# Altium footprint library 2016AbbasBasereh9365731239.PcbLib: 204 footprints (part 5 of 13)
Each footprint in its own frame and in the unit in brackets; x right, y up, seen from the top. Pads: shape width x height; smd on the part's side, far side on the other; paste and mask are expansions set on the pad; w line width, h text height; cw(c..) or ccw(c..) is an arc to the next point about the centre after c.
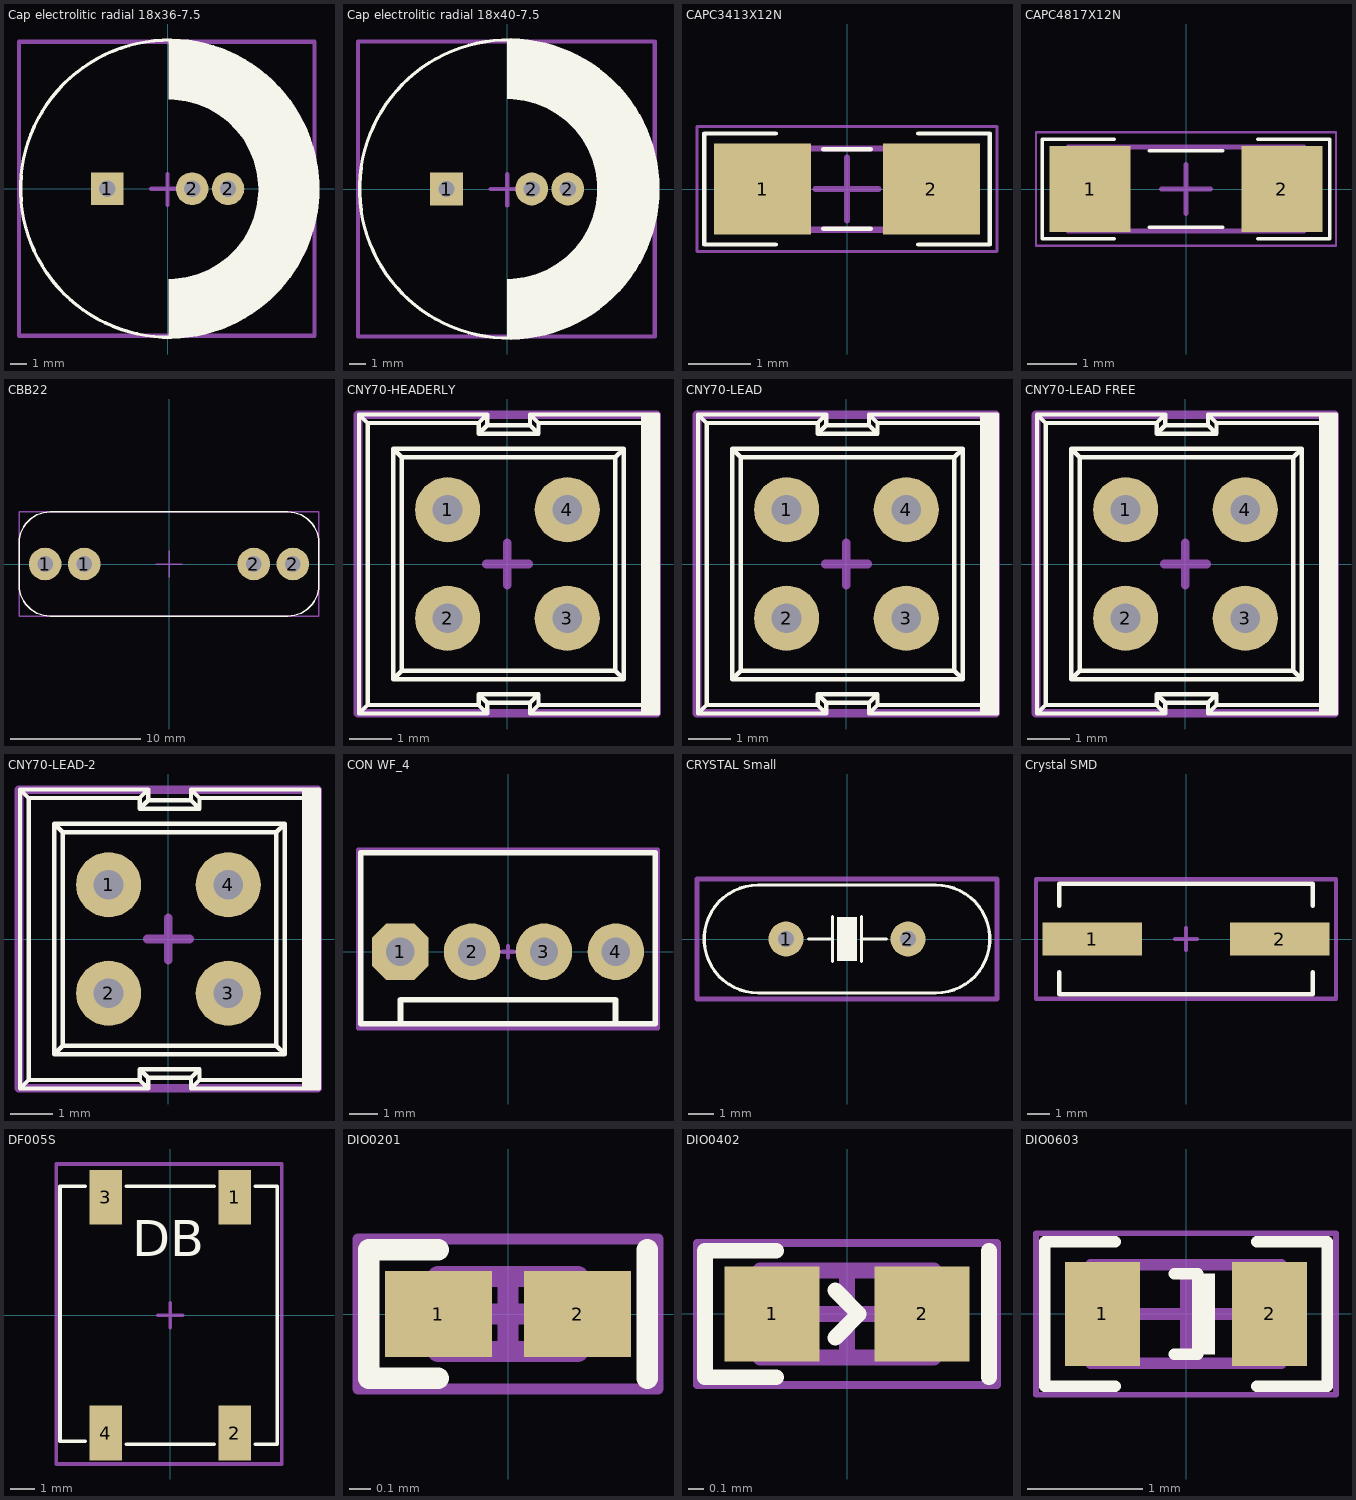
[diagram p4: the footprints below, top view; thin cyan lines are the x and y axes]

## Cap electrolitic radial 18x36-7.5 [mm] "Cap electrolitic radial 18x36-7.5-Design:Abbas Basereh"
height 36
pads (3):
  rect 2x2 hole 1: 1(-3.7,0)
  round 2 hole 1: 2(1.5,0) 2(3.7,0)
Top Overlay:
  circle w0.2: c0.096,0 r9.1
  region: 0.074,9.065 0.17,9.065 0.617,9.065 1.506,8.977 2.383,8.803 3.239,8.543 4.065,8.201 4.854,7.78 5.597,7.283 6.288,6.716 6.92,6.083 7.488,5.392 7.984,4.649 8.406,3.86 8.748,3.034 9.008,2.179 9.182,1.302 9.27,0.412 9.27,-0.035 9.27,-0.482 9.182,-1.372 9.008,-2.249 8.748,-3.105 8.406,-3.931 7.984,-4.719 7.488,-5.463 6.92,-6.154 6.288,-6.786 5.597,-7.353 4.854,-7.85 4.065,-8.271 3.239,-8.614 2.383,-8.873 1.506,-9.047 0.617,-9.135 0.17,-9.135 0.074,-9.135 0.074,-5.535 0.433,-5.523 1.147,-5.429 1.842,-5.243 2.506,-4.968 3.129,-4.608 3.7,-4.17 4.209,-3.662 4.647,-3.091 5.006,-2.468 5.282,-1.803 5.468,-1.108 5.562,-0.395 5.574,-0.035 5.562,0.325 5.468,1.038 5.282,1.733 5.006,2.397 4.647,3.021 4.209,3.591 3.7,4.1 3.129,4.538 2.506,4.898 1.842,5.173 1.147,5.359 0.433,5.453 0.074,5.465
Mechanical 15:
  lines w0.254: -1,0 1,0 ; 0,-1 0,0.9 ; -9.1,-9 -9.1,9 9,9 9,-9 -9.1,-9
3D body "User Library-Cap-EL(18x36-7_5)T.STEP": height 37, standoff -3, extent -9,-9 9.002,9

## Cap electrolitic radial 18x40-7.5 [mm] "Cap electrolitic radial 18x40-7.5-Design:Abbas Basereh"
height 40
pads (3):
  rect 2x2 hole 1: 1(-3.7,0)
  round 2 hole 1: 2(1.5,0) 2(3.7,0)
Top Overlay:
  circle w0.2: c0.096,0 r9.1
  region: 0.004,9.1 0.1,9.1 0.547,9.1 1.437,9.012 2.314,8.838 3.169,8.578 3.995,8.236 4.784,7.815 5.527,7.318 6.219,6.751 6.851,6.119 7.418,5.427 7.915,4.684 8.336,3.895 8.678,3.069 8.938,2.214 9.112,1.337 9.2,0.447 9.2,0 9.2,-0.447 9.112,-1.337 8.938,-2.214 8.678,-3.069 8.336,-3.895 7.915,-4.684 7.418,-5.427 6.851,-6.119 6.219,-6.751 5.527,-7.318 4.784,-7.815 3.995,-8.236 3.169,-8.578 2.314,-8.838 1.437,-9.012 0.547,-9.1 0.1,-9.1 0.004,-9.1 0.004,-5.5 0.364,-5.488 1.077,-5.394 1.772,-5.208 2.437,-4.933 3.06,-4.573 3.63,-4.135 4.139,-3.626 4.577,-3.056 4.937,-2.433 5.212,-1.768 5.398,-1.073 5.492,-0.36 5.504,0 5.492,0.36 5.398,1.073 5.212,1.768 4.937,2.433 4.577,3.056 4.139,3.626 3.63,4.135 3.06,4.573 2.437,4.933 1.772,5.208 1.077,5.394 0.364,5.488 0.004,5.5
Mechanical 15:
  lines w0.254: -1,0 1,0 ; 0,-1 0,0.9 ; -9.1,-9 -9.1,9 9,9 9,-9 -9.1,-9
3D body "User Library-Cap-EL(18x40-7_5)T.STEP": height 41, standoff -3, extent -9,-8.999 9.002,9

## CAPC3413X12N [mm] "Chip Capacitor, 2-Leads, Body 3/40x1/30mm, IPC Medium Density-Design:Abbas Basereh"
height 1.2
pads (2):
  rect 1.55x1.45 smd: 1(-1.35,0) 2(1.35,0)
Top Overlay:
  lines w0.07: -1.143,-0.889 -2.286,-0.889 -2.286,0.889 -1.143,0.889 ; -0.381,-0.635 0.381,-0.635 ; -0.381,0.635 0.381,0.635 ; 1.143,-0.889 2.286,-0.889 2.286,0.889 1.143,0.889
Mechanical 13:
  lines w0.1: -1.7,-0.65 1.7,-0.65 1.7,0.65 -1.7,0.65 -1.7,-0.65
Mechanical 15:
  lines w0.05: -2.4,-1 2.4,-1 2.4,1 -2.4,1 -2.4,-1
  lines w0.1: -0.5,0 0.5,0 ; 0,-0.5 0,0.5
3D body "SW3dPS-0805 SMD Capacitor.STEP": height 0.78, standoff 0, extent -1,-0.625 1,0.625

## CAPC4817X12N [mm] "Chip Capacitor, 2-Leads, Body 4/80x1/70mm, IPC Medium Density-Design:Abbas Basereh"
height 1.2
pads (2):
  rect 1.65x1.75 smd: 1(-1.95,0) 2(1.95,0)
Top Overlay:
  lines w0.07: -1.46,-1.016 -2.921,-1.016 -2.921,1.016 -1.46,1.016 ; -0.75,-0.775 0.75,-0.775 ; -0.75,0.775 0.75,0.775 ; 1.46,-1.016 2.921,-1.016 2.921,1.016 1.46,1.016
Mechanical 13:
  lines w0.1: -2.4,-0.85 -2.4,0.85 2.4,0.85 2.4,-0.85 -2.4,-0.85
Mechanical 15:
  lines w0.05: -3.05,-1.15 -3.05,1.15 3.05,1.15 3.05,-1.15 -3.05,-1.15
  lines w0.1: -0.5,0 0.5,0 ; 0,-0.5 0,0.5
3D body "SW3dPS-1206 SMD Capacitor.STEP": height 1, standoff 0, extent -1.6,-0.8 1.6,0.8

## CBB22 [mm] "W23_0_H14_5_T8_0_P19"
height 13
pads (4):
  round 2.5 hole 1.2: 1(-9.5,0) 1(-6.5,0) 2(6.5,0) 2(9.5,0)
Top Overlay:
  lines w0.1: -11.5,-1.587 ccw(c-9.087,-1.587) -9.087,-4 9.087,-4 ccw(c9.087,-1.587) 11.5,-1.587 11.5,0 11.5,1.587 ccw(c9.087,1.587) 9.087,4 0,4 -9.087,4 ccw(c-9.087,1.587) -11.5,1.587 -11.5,0 -11.5,-1.587
Mechanical 15:
  lines w0.1: -1,0 1,0 ; 0,-1 0,1 ; -11.5,-4 -11.5,4 11.5,4 11.5,-4 -11.5,-4
3D body "User Library-CBB81_W23_0_H14_5_T8_0_P19_0.STEP": height 19.5, standoff -8, extent -11.499,-4 11.5,4

## CNY70-HEADERLY [mm] "Dimensions (L x W x H in mm): 7 x 7 x 6  • Peak operating distance: < 0.5 mm DESIGNER ABBAS BASEREH"
height 6
pads (4):
  round 1.524 hole 0.7: 1(-1.4,1.27) 2(-1.4,-1.27) 3(1.4,-1.27) 4(1.4,1.27)
Top Overlay:
  rectangle: 3.125,-3.5 3.525,3.5
  lines w0.1: -3.475,-3.5 -3.475,3.5 ; -3.475,-3.5 -3.275,-3.3 ; -3.475,-3.5 -0.475,-3.5 ; -3.475,3.5 -0.475,3.5 ; -3.475,3.5 -3.275,3.3 ; -3.275,-3.3 -3.275,3.3 ; -3.275,-3.3 -0.675,-3.3 ; -3.275,3.3 -0.675,3.3 ; -2.675,-2.7 2.725,-2.7 ; -2.675,-2.7 -2.675,2.7 ; -2.675,-2.7 -2.475,-2.5 ; -2.675,2.7 2.725,2.7 ; -2.675,2.7 -2.475,2.5 ; -2.475,-2.5 2.525,-2.5 ; -2.475,-2.5 -2.475,2.5 ; -2.475,2.5 2.525,2.5 ; -0.675,-3.3 -0.475,-3.5 ; -0.675,-3.3 -0.675,-3.05 ; -0.675,-3.05 -0.475,-3.25 ; -0.675,-3.05 0.725,-3.05 ; -0.675,3.05 -0.475,3.25 ; -0.675,3.05 -0.675,3.3 ; -0.675,3.05 0.725,3.05 ; -0.675,3.3 -0.475,3.5 ; -0.475,-3.5 -0.475,-3.25 ; -0.475,-3.25 0.525,-3.25 ; -0.475,3.25 -0.475,3.5 ; -0.475,3.25 0.525,3.25 ; 0.525,-3.5 0.525,-3.25 ; 0.525,-3.5 0.725,-3.3 ; 0.525,-3.5 3.525,-3.5 ; 0.525,-3.25 0.725,-3.05 ; 0.525,3.25 0.525,3.5 ; 0.525,3.25 0.725,3.05 ; 0.525,3.5 3.525,3.5 ; 0.525,3.5 0.725,3.3 ; 0.725,-3.3 0.725,-3.05 ; 0.725,-3.3 3.325,-3.3 ; 0.725,3.05 0.725,3.3 ; 0.725,3.3 3.325,3.3 ; 2.525,-2.5 2.525,2.5 ; 2.525,-2.5 2.725,-2.7 ; 2.525,2.5 2.725,2.7 ; 2.725,-2.7 2.725,2.7 ; 3.325,-3.3 3.325,3.3 ; 3.325,-3.3 3.525,-3.5 ; 3.325,3.3 3.525,3.5 ; 3.525,-3.5 3.525,3.5
Mechanical 15:
  lines w0.2: -0.5,0 0.5,0 ; 0,-0.5 0,0.5 ; -3.5,-3.5 3.5,-3.5 3.5,3.5 -3.5,3.5 -3.5,-3.5
3D body "User Library-cny70-2.STEP": height 11.5, standoff -2.5, extent -3.55,-3.5 3.45,3.5

## CNY70-LEAD [mm] "Dimensions (L x W x H in mm): 7 x 7 x 6  • Peak operating distance: < 0.5 mm DESIGNER ABBAS BASEREH"
height 6
pads (4):
  round 1.524 hole 0.7: 1(-1.4,1.27) 2(-1.4,-1.27) 3(1.4,-1.27) 4(1.4,1.27)
Top Overlay:
  rectangle: 3.125,-3.5 3.525,3.5
  lines w0.1: -3.475,-3.5 -3.475,3.5 ; -3.475,-3.5 -3.275,-3.3 ; -3.475,-3.5 -0.475,-3.5 ; -3.475,3.5 -0.475,3.5 ; -3.475,3.5 -3.275,3.3 ; -3.275,-3.3 -3.275,3.3 ; -3.275,-3.3 -0.675,-3.3 ; -3.275,3.3 -0.675,3.3 ; -2.675,-2.7 2.725,-2.7 ; -2.675,-2.7 -2.675,2.7 ; -2.675,-2.7 -2.475,-2.5 ; -2.675,2.7 2.725,2.7 ; -2.675,2.7 -2.475,2.5 ; -2.475,-2.5 2.525,-2.5 ; -2.475,-2.5 -2.475,2.5 ; -2.475,2.5 2.525,2.5 ; -0.675,-3.3 -0.475,-3.5 ; -0.675,-3.3 -0.675,-3.05 ; -0.675,-3.05 -0.475,-3.25 ; -0.675,-3.05 0.725,-3.05 ; -0.675,3.05 -0.475,3.25 ; -0.675,3.05 -0.675,3.3 ; -0.675,3.05 0.725,3.05 ; -0.675,3.3 -0.475,3.5 ; -0.475,-3.5 -0.475,-3.25 ; -0.475,-3.25 0.525,-3.25 ; -0.475,3.25 -0.475,3.5 ; -0.475,3.25 0.525,3.25 ; 0.525,-3.5 0.525,-3.25 ; 0.525,-3.5 0.725,-3.3 ; 0.525,-3.5 3.525,-3.5 ; 0.525,-3.25 0.725,-3.05 ; 0.525,3.25 0.525,3.5 ; 0.525,3.25 0.725,3.05 ; 0.525,3.5 3.525,3.5 ; 0.525,3.5 0.725,3.3 ; 0.725,-3.3 0.725,-3.05 ; 0.725,-3.3 3.325,-3.3 ; 0.725,3.05 0.725,3.3 ; 0.725,3.3 3.325,3.3 ; 2.525,-2.5 2.525,2.5 ; 2.525,-2.5 2.725,-2.7 ; 2.525,2.5 2.725,2.7 ; 2.725,-2.7 2.725,2.7 ; 3.325,-3.3 3.325,3.3 ; 3.325,-3.3 3.525,-3.5 ; 3.325,3.3 3.525,3.5 ; 3.525,-3.5 3.525,3.5
Mechanical 15:
  lines w0.2: -0.5,0 0.5,0 ; 0,-0.5 0,0.5 ; -3.5,-3.5 3.5,-3.5 3.5,3.5 -3.5,3.5 -3.5,-3.5
3D body "SW3dPS-cny70-1.STEP": height 6.5, standoff -5.25, extent -3.5,-3.5 3.5,3.5

## CNY70-LEAD FREE [mm] "Dimensions (L x W x H in mm): 7 x 7 x 6  • Peak operating distance: < 0.5 mm DESIGNER ABBAS BASEREH"
height 6
pads (4):
  round 1.524 hole 0.7: 1(-1.4,1.27) 2(-1.4,-1.27) 3(1.4,-1.27) 4(1.4,1.27)
Top Overlay:
  rectangle: 3.125,-3.5 3.525,3.5
  lines w0.1: -3.475,-3.5 -3.475,3.5 ; -3.475,-3.5 -3.275,-3.3 ; -3.475,-3.5 -0.475,-3.5 ; -3.475,3.5 -0.475,3.5 ; -3.475,3.5 -3.275,3.3 ; -3.275,-3.3 -3.275,3.3 ; -3.275,-3.3 -0.675,-3.3 ; -3.275,3.3 -0.675,3.3 ; -2.675,-2.7 2.725,-2.7 ; -2.675,-2.7 -2.675,2.7 ; -2.675,-2.7 -2.475,-2.5 ; -2.675,2.7 2.725,2.7 ; -2.675,2.7 -2.475,2.5 ; -2.475,-2.5 2.525,-2.5 ; -2.475,-2.5 -2.475,2.5 ; -2.475,2.5 2.525,2.5 ; -0.675,-3.3 -0.475,-3.5 ; -0.675,-3.3 -0.675,-3.05 ; -0.675,-3.05 -0.475,-3.25 ; -0.675,-3.05 0.725,-3.05 ; -0.675,3.05 -0.475,3.25 ; -0.675,3.05 -0.675,3.3 ; -0.675,3.05 0.725,3.05 ; -0.675,3.3 -0.475,3.5 ; -0.475,-3.5 -0.475,-3.25 ; -0.475,-3.25 0.525,-3.25 ; -0.475,3.25 -0.475,3.5 ; -0.475,3.25 0.525,3.25 ; 0.525,-3.5 0.525,-3.25 ; 0.525,-3.5 0.725,-3.3 ; 0.525,-3.5 3.525,-3.5 ; 0.525,-3.25 0.725,-3.05 ; 0.525,3.25 0.525,3.5 ; 0.525,3.25 0.725,3.05 ; 0.525,3.5 3.525,3.5 ; 0.525,3.5 0.725,3.3 ; 0.725,-3.3 0.725,-3.05 ; 0.725,-3.3 3.325,-3.3 ; 0.725,3.05 0.725,3.3 ; 0.725,3.3 3.325,3.3 ; 2.525,-2.5 2.525,2.5 ; 2.525,-2.5 2.725,-2.7 ; 2.525,2.5 2.725,2.7 ; 2.725,-2.7 2.725,2.7 ; 3.325,-3.3 3.325,3.3 ; 3.325,-3.3 3.525,-3.5 ; 3.325,3.3 3.525,3.5 ; 3.525,-3.5 3.525,3.5
Mechanical 15:
  lines w0.2: -0.5,0 0.5,0 ; 0,-0.5 0,0.5 ; -3.5,-3.5 3.5,-3.5 3.5,3.5 -3.5,3.5 -3.5,-3.5
3D body "CNY70.STEP": height 6.01, standoff 0.01, extent -3.475,-3.5 3.525,3.5

## CNY70-LEAD-2 [mm] "Dimensions (L x W x H in mm): 7 x 7 x 6  • Peak operating distance: < 0.5 mm DESIGNER ABBAS BASEREH"
height 6
pads (4):
  round 1.524 hole 0.7: 1(-1.4,1.27) 2(-1.4,-1.27) 3(1.4,-1.27) 4(1.4,1.27)
Top Overlay:
  rectangle: 3.125,-3.5 3.525,3.5
  lines w0.1: -3.475,-3.5 -3.475,3.5 ; -3.475,-3.5 -3.275,-3.3 ; -3.475,-3.5 -0.475,-3.5 ; -3.475,3.5 -0.475,3.5 ; -3.475,3.5 -3.275,3.3 ; -3.275,-3.3 -3.275,3.3 ; -3.275,-3.3 -0.675,-3.3 ; -3.275,3.3 -0.675,3.3 ; -2.675,-2.7 2.725,-2.7 ; -2.675,-2.7 -2.675,2.7 ; -2.675,-2.7 -2.475,-2.5 ; -2.675,2.7 2.725,2.7 ; -2.675,2.7 -2.475,2.5 ; -2.475,-2.5 2.525,-2.5 ; -2.475,-2.5 -2.475,2.5 ; -2.475,2.5 2.525,2.5 ; -0.675,-3.3 -0.475,-3.5 ; -0.675,-3.3 -0.675,-3.05 ; -0.675,-3.05 -0.475,-3.25 ; -0.675,-3.05 0.725,-3.05 ; -0.675,3.05 -0.475,3.25 ; -0.675,3.05 -0.675,3.3 ; -0.675,3.05 0.725,3.05 ; -0.675,3.3 -0.475,3.5 ; -0.475,-3.5 -0.475,-3.25 ; -0.475,-3.25 0.525,-3.25 ; -0.475,3.25 -0.475,3.5 ; -0.475,3.25 0.525,3.25 ; 0.525,-3.5 0.525,-3.25 ; 0.525,-3.5 0.725,-3.3 ; 0.525,-3.5 3.525,-3.5 ; 0.525,-3.25 0.725,-3.05 ; 0.525,3.25 0.525,3.5 ; 0.525,3.25 0.725,3.05 ; 0.525,3.5 3.525,3.5 ; 0.525,3.5 0.725,3.3 ; 0.725,-3.3 0.725,-3.05 ; 0.725,-3.3 3.325,-3.3 ; 0.725,3.05 0.725,3.3 ; 0.725,3.3 3.325,3.3 ; 2.525,-2.5 2.525,2.5 ; 2.525,-2.5 2.725,-2.7 ; 2.525,2.5 2.725,2.7 ; 2.725,-2.7 2.725,2.7 ; 3.325,-3.3 3.325,3.3 ; 3.325,-3.3 3.525,-3.5 ; 3.325,3.3 3.525,3.5 ; 3.525,-3.5 3.525,3.5
Mechanical 15:
  lines w0.2: -0.5,0 0.5,0 ; 0,-0.5 0,0.5 ; -3.5,-3.5 3.5,-3.5 3.5,3.5 -3.5,3.5 -3.5,-3.5
3D body "CNY70.SLDPRT": height 6, standoff -6.75, extent -3.15,-3.15 3.15,3.15

## CON WF_4 [mm] "DS1070  WF, Cvilux CI31 pitch 2.54mm-Designer Abbas Basereh"
pads (4):
  oct 2x2 hole 1: 1(-3.81,0)
  round 2 hole 1: 2(-1.27,0) 3(1.27,0) 4(3.81,0)
Top Overlay:
  lines w0.2: -3.8,-2.548 -3.8,-1.7 3.8,-1.7 3.8,-2.548 ; -5.2,-2.548 5.2,-2.548 5.2,3.5 -5.2,3.5 -5.2,-2.548
Mechanical 15:
  lines w0.15: -0.2,0 0.2,0 ; 0,-0.2 0,0.2 ; -5.3,-2.7 5.3,-2.7 5.3,3.6 -5.3,3.6 -5.3,-2.7
3D body "User Library-CI31_4.step": height 11.56, standoff -3.24, extent -5.08,-2.402 5.08,3.398

## CRYSTAL Small [mil] "DESIGNER ABBAS BASEREH"
height 157.48
pads (2):
  round 55 hole 25: 1(-96.06,0) 2(96.06,0)
Top Overlay:
  rectangle: -15.75,-35 15.75,35
  lines w5: -60.87,0 -22.87,0 ; -22.87,-35 -22.87,35 ; 22.87,-35 22.87,35 ; 22.87,0 61.87,0 ; -140,-85 cw(c-140,0) -140,85 140,85 cw(c140,0) 140,-85 -140,-85
Mechanical 15:
  lines w7.87: -7.87,0 7.87,0 ; 0,-7.87 0,7.87 ; -236.22,-94.49 236.22,-94.49 236.22,94.49 -236.22,94.49 -236.22,-94.49
3D body "Crystal-3.8mm.STEP": height 142.13, standoff -76.77, extent -226.37,-88.58 226.38,88.59

## Crystal SMD [mm] "DESIGNER ABBAS BASEREH"
height 4
pads (2):
  rect 4.5x1.5 smd: 1(-4.25,0) 2(4.25,0)
Top Overlay:
  lines w0.2: -5.75,-1.5 -5.75,-2.5 5.75,-2.5 5.75,-1.5 ; -5.75,1.5 -5.75,2.5 5.75,2.5 5.75,1.5
Mechanical 15:
  lines w0.2: -0.5,0 0.5,0 ; 0,-0.5 0,0.5 ; -6.8,-2.7 -6.8,2.7 6.8,2.7 6.8,-2.7 -6.8,-2.7
3D body "User Library-HC49_SMD.STEP": height 5.18, standoff 0, extent -6.209,-2.25 6.091,2.25

## DF005S [mm] "MINIATURE GLASS PASSIVATED SINGLE-PHASE SURFACE MOUNT  BRIDGE RECTIFIER-Design:Abbas Basereh"
height 3.3
pads (4):
  rect 1.3x2.2 smd: 1(2.6,4.75) 2(2.6,-4.75) 3(-2.6,4.75) 4(-2.6,-4.75)
Top Overlay:
  lines w0.15: -3.429,-5.08 -4.445,-5.08 -4.445,5.207 -3.429,5.207 ; -1.778,-5.207 1.778,-5.207 ; -1.778,5.207 1.778,5.207 ; 3.429,-5.207 4.318,-5.207 4.318,5.207 3.429,5.207
  text "DB" at -1.524,1.905 h2.5
Mechanical 15:
  lines w0.15: -0.5,0 0.5,0 ; 0,-0.5 0,0.5 ; -4.6,-6 -4.6,6.1 4.5,6.1 4.5,-6 -4.6,-6
3D body "User Library-DFXXS.STEP": height 3.58, standoff 0.01, extent -4.315,-5.099 4.195,5.201

## DIO0201 [mm] "Chip Diode, 2-Leads, Body 0/60x0/30mm, IPC Medium Density DESIGNER:ABBAS BASEREH"
height 0.23
pads (2):
  rect 0.5x0.4 smd mask+0.04: 1(-0.325,0) 2(0.325,0)
Top Overlay:
  lines w0.1: -0.325,-0.3 -0.65,-0.3 -0.65,0.3 -0.325,0.3 ; 0.65,-0.3 0.65,0.3
Mechanical 13:
  lines w0.1: -0.325,-0.175 -0.325,0.175 0.325,0.175 0.325,-0.175 -0.325,-0.175
Mechanical 15:
  lines w0.05: -0.7,-0.35 -0.7,0.35 0.7,0.35 0.7,-0.35 -0.7,-0.35
  lines w0.1: -0.175,0 0.175,0 ; 0,-0.175 0,0.175
3D body "DIO0201.step": height 0.23, standoff 0, extent -0.325,-0.175 0.325,0.175

## DIO0402 [mm] "Chip Diode, 2-Leads, Body 1/00x0/50mm, IPC Medium Density DESIGNER:ABBAS BASEREH"
height 0.32
pads (2):
  rect 0.6x0.6 smd mask+0.06: 1(-0.475,0) 2(0.475,0)
Top Overlay:
  lines w0.1: -0.45,-0.4 -0.9,-0.4 -0.9,0.4 -0.45,0.4 ; -0.075,-0.15 0.075,0 -0.075,0.15 ; 0.9,-0.4 0.9,0.4
Mechanical 13:
  lines w0.1: -0.55,-0.275 0.55,-0.275 0.55,0.275 -0.55,0.275 -0.55,-0.275
Mechanical 15:
  lines w0.05: -0.95,-0.45 0.95,-0.45 0.95,0.45 -0.95,0.45 -0.95,-0.45
  lines w0.1: -0.275,0 0.275,0 ; 0,-0.275 0,0.275
3D body "DIO0402.step": height 0.32, standoff 0, extent -0.55,-0.275 0.55,0.275

## DIO0603 [mm] "Chip Diode, 2-Leads, Body 1/60x0/80mm, IPC Medium Density DESIGNER:ABBAS BASEREH"
height 0.4
pads (2):
  rect 0.65x0.9 smd: 1(-0.725,0) 2(0.725,0)
Top Overlay:
  rectangle: 0.05,-0.35 0.25,0.35
  lines w0.1: -0.612,-0.625 -1.225,-0.625 -1.225,0.625 -0.612,0.625 ; -0.1,-0.35 0.1,-0.35 ; -0.1,0.35 0.1,0.35 ; 0.612,-0.625 1.225,-0.625 1.225,0.625 0.612,0.625
Mechanical 13:
  lines w0.1: -0.825,-0.425 -0.825,0.425 0.825,0.425 0.825,-0.425 -0.825,-0.425
Mechanical 15:
  lines w0.05: -1.3,-0.7 -1.3,0.7 1.3,0.7 1.3,-0.7 -1.3,-0.7
  lines w0.1: -0.425,0 0.425,0 ; 0,-0.425 0,0.425
3D body "DIO0603.step": height 0.4, standoff 0, extent -0.825,-0.425 0.825,0.425